# Altium schematic symbol library FPGA_Xilinx_Virtex6.SchLib: 28 symbols (part 12 of 15) (continued)
## XC6VLX550T-FF1760 (continued)
part O pins: A2 IO_L3N_47, A4 IO_L1N_47, B1 IO_L16P_47, B2 IO_L16N_47, B3 IO_L3P_47, B4 IO_L1P_47, B5 VCCO_47, C1 IO_L18P_47, C2 VCCO_47, C3 IO_L9P_MRCC_47, C4 IO_L9N_MRCC_47, C5 IO_L7P_47, D1 IO_L1P_46, D2 IO_L18N_47, D3 IO_L14N_VREF_47, D5 IO_L7N_47, E2 IO_L1N_46, E3 IO_L14P_47, E4 IO_L10N_MRCC_47, E5 IO_L5N_47, F1 IO_L3P_46, F2 IO_L3N_46, F3 VCCO_46, F4 IO_L10P_MRCC_47, F5 IO_L5P_47, G1 IO_L8P_SRCC_46, G2 IO_L8N_SRCC_46, G3 IO_L7P_46, G4 IO_L6N_47, H1 IO_L16N_46, H3 IO_L7N_46, H4 IO_L6P_47, H5 IO_L2P_47, H6 IO_L2N_47, J1 IO_L16P_46, J2 IO_L19P_46, J3 IO_L19N_46, J4 VCCO_47, J5 IO_L15N_47, J6 IO_L0P_47, K1 VCCO_46, K2 IO_L6N_46, K3 IO_L9P_MRCC_46, K4 IO_L9N_MRCC_46, K5 IO_L15P_47, K7 IO_L0N_47, L1 IO_L18P_46, L2 IO_L6P_46, L4 IO_L4P_46, L5 IO_L0P_46, L6 IO_L12P_VRN_47, L7 IO_L8N_SRCC_47, L8 VCCO_47, L9 IO_L13N_47, M2 IO_L18N_46, M3 IO_L14N_VREF_46, M4 IO_L4N_VREF_46, M5 VCCO_46, M6 IO_L0N_46, M7 IO_L12N_VRP_47, M8 IO_L8P_SRCC_47, M9 IO_L13P_47, M11 IO_L17P_47, N3 IO_L14P_46, N4 IO_L10N_MRCC_46, N5 IO_L5P_46, N6 IO_L5N_46, N8 IO_L11P_SRCC_46, N9 IO_L4P_47, N10 IO_L4N_VREF_47, N11 IO_L17N_47, N12 VCCO_47, N13 IO_L11P_SRCC_47, P5 IO_L10P_MRCC_46, P6 IO_L15N_46, P7 IO_L11N_SRCC_46, P8 IO_L17P_46, P9 VCCO_46, P10 IO_L13N_46, P11 IO_L19P_47, P12 IO_L19N_47, P13 IO_L11N_SRCC_47, R6 VCCO_46, R7 IO_L15P_46, R8 IO_L17N_46, R9 IO_L13P_46, R10 IO_L2N_46, T9 IO_L2P_46, T10 IO_L12N_VRP_46, T11 IO_L12P_VRN_46
part P pins: AA21 VREFN_0, AA22 VP_0, AB21 VN_0, AB22 VREFP_0, AC21 DXN_0, AC22 DXP_0, AD31 RDWR_B_0, AE12 TMS_0, AF13 CCLK_0, AF14 TDI_0, AF29 DIN_0, AF30 CSI_B_0, AH13 TDO_0, AH14 TCK_0, AH28 DOUT_BUSY_0, R14 INIT_B_0, R16 VCCO_0, R29 M1_0, R30 M0_0, T14 DONE_0, T15 HSWAPEN_0, T29 M2_0, T30 PROGRAM_B_0, U15 VCCO_0
part Q pins: A3 GND, A13 GND, A23 GND, A33 GND, AA12 VCCAUX, AA14 VCCINT, AA16 VCCINT, AA18 VCCINT, AA20 VCCINT, AA24 VCCINT, AA26 VCCINT, AA28 VCCINT, AA30 VCCAUX, AB13 VCCAUX, AB15 VCCINT, AB17 VCCINT, AB19 VCCINT, AB23 VCCINT, AB25 VCCINT, AB27 VCCINT, AB29 VCCAUX, AB31 VCCAUX, AC12 VCCAUX, AC14 VCCINT, AC16 VCCINT, AC18 VCCINT, AC20 VCCINT, AC24 VCCINT, AC26 VCCINT, AC28 VCCINT, AC30 VCCAUX, AD13 VCCAUX, AD15 VCCINT, AD17 VCCINT, AD19 VCCINT, AD21 VCCINT, AD23 VCCINT, AD25 VCCINT, AD27 VCCINT, AD29 VCCAUX, AE14 VCCINT, AE16 VCCINT, AE18 VCCINT, AE20 VCCINT, AE22 VCCINT, AE24 VCCINT, AE26 VCCINT, AE28 VCCINT, AE30 VCCAUX, AF15 VCCINT, AF17 VCCINT, AF19 VCCINT, AF21 VCCINT, AF23 VCCINT, AF25 VCCINT, AF27 VCCINT, AG14 VCCINT, AG16 VCCINT, AG18 VCCINT, AG20 VCCINT, AG22 VCCINT, AG24 VCCINT, AG26 VCCINT, AG28 VCCINT, AG29 VFS_0, AH15 VCCINT, AH17 VCCINT, AH19 VCCINT, AH21 VCCINT, AH23 VCCINT, AH25 VCCINT, AH27 VCCINT, B10 GND, B20 GND, B30 GND, B40 GND, C7 GND, C17 GND, C27 GND, C37 GND, D4 GND, D14 GND, D24 GND, D34 GND, E1 GND, E11 GND, E21 GND, E31 GND, E41 GND, F8 GND, F18 GND, F28 GND, F38 GND, G5 GND, G15 GND, G25 GND, G35 GND, H2 GND, H12 GND, H22 GND, H32 GND, H42 GND, J9 GND, J19 GND, J29 GND, J39 GND, K6 GND, K16 GND, K26 GND, K36 GND, L3 GND, L13 GND, L23 GND, L33 GND, M10 GND, M20 GND, M30 GND, M40 GND, N7 GND, N17 GND, N27 GND, N37 GND, P4 GND, P14 GND, P24 GND, P34 GND, R1 GND, R11 GND, R12 VCCAUX, R13 GND, R18 VCCINT, R19 GND, R20 VCCINT, R21 GND, R22 VCCINT, R23 GND, R24 VCCINT, R31 GND, R41 GND, T8 GND, T12 GND, T13 VCCAUX, T16 GND, T17 VCCINT, T18 GND, T19 VCCINT, T20 GND, T21 VCCINT, T22 GND, T23 VCCINT, T24 GND, T25 VCCINT, T26 GND, T27 VCCINT, T28 GND, T38 GND, U5 GND, U12 VCCAUX, U13 GND, U14 VBATT_0, U16 VCCINT, U17 GND, U18 VCCINT, U19 GND, U20 VCCINT, U21 GND, U22 VCCINT, U23 GND, U24 VCCINT, U25 GND, U26 VCCINT, U27 GND, U28 VCCINT, U29 GND, U30 VCCAUX, U35 GND, V2 GND, V12 GND, V13 VCCAUX, V14 GND, V15 VCCINT, V16 GND, V17 VCCINT, V18 GND, V19 VCCINT, V20 GND, V21 VCCINT, V22 GND, V23 VCCINT, V24 GND, V25 VCCINT, V26 GND, V27 VCCINT, V28 GND, V29 VCCAUX, V30 GND, V31 VCCAUX, V32 GND, V42 GND, W9 GND, W12 VCCAUX, W14 VCCINT, W16 VCCINT, W18 VCCINT, W20 VCCINT, W22 VCCINT, W24 VCCINT, W26 VCCINT, W28 VCCINT, W30 VCCAUX, Y13 VCCAUX, Y15 VCCINT, Y17 VCCINT, Y19 VCCINT, Y21 AVSS_0, Y22 AVDD_0, Y23 VCCINT, Y25 VCCINT, Y27 VCCINT, Y29 VCCINT, Y31 VCCAUX
part R pins: AA3 GND, AA13 GND, AA15 GND, AA17 GND, AA19 GND, AA23 GND, AA25 GND, AA27 GND, AA29 GND, AA31 GND, AA33 GND, AB10 GND, AB12 GND, AB14 GND, AB16 GND, AB18 GND, AB20 GND, AB24 GND, AB26 GND, AB28 GND, AB30 GND, AB40 GND, AC7 GND, AC13 GND, AC15 GND, AC17 GND, AC19 GND, AC23 GND, AC25 GND, AC27 GND, AC29 GND, AC31 GND, AC37 GND, AD4 GND, AD12 GND, AD14 GND, AD16 GND, AD18 GND, AD20 GND, AD22 GND, AD24 GND, AD26 GND, AD28 GND, AD30 GND, AD34 GND, AE1 GND, AE11 GND, AE13 GND, AE15 GND, AE17 GND, AE19 GND, AE21 GND, AE23 GND, AE25 GND, AE27 GND, AE29 GND, AE31 GND, AE41 GND, AF8 GND, AF16 GND, AF18 GND, AF20 GND, AF22 GND, AF24 GND, AF26 GND, AF28 GND, AF38 GND, AG5 GND, AG13 GND, AG15 GND, AG17 GND, AG19 GND, AG21 GND, AG23 GND, AG25 GND, AG27 GND, AG35 GND, AH2 GND, AH12 GND, AH18 GND, AH20 GND, AH22 GND, AH24 GND, AH32 GND, AH42 GND, AJ9 GND, AJ19 GND, AJ29 GND, AJ39 GND, AK6 GND, AK16 GND, AK26 GND, AK36 GND, AL3 GND, AL13 GND, AL23 GND, AL33 GND, AM10 GND, AM20 GND, AM30 GND, AM40 GND, AN7 GND, AN17 GND, AN27 GND, AN37 GND, AP4 GND, AP14 GND, AP24 GND, AP34 GND, AR1 GND, AR11 GND, AR21 GND, AR31 GND, AR41 GND, AT8 GND, AT18 GND, AT28 GND, AT38 GND, AU5 GND, AU15 GND, AU25 GND, AU35 GND, AV2 GND, AV12 GND, AV22 GND, AV32 GND, AV42 GND, AW9 GND, AW19 GND, AW29 GND, AW39 GND, AY6 GND, AY16 GND, AY26 GND, AY36 GND, BA3 GND, BA13 GND, BA23 GND, BA33 GND, BB10 GND, BB20 GND, BB30 GND, BB40 GND, W13 GND, W15 GND, W17 GND, W19 GND, W21 GND, W23 GND, W25 GND, W27 GND, W29 GND, W31 GND, W39 GND, Y6 GND, Y12 GND, Y14 GND, Y16 GND, Y18 GND, Y20 GND, Y24 GND, Y26 GND, Y28 GND, Y30 GND, Y36 GND

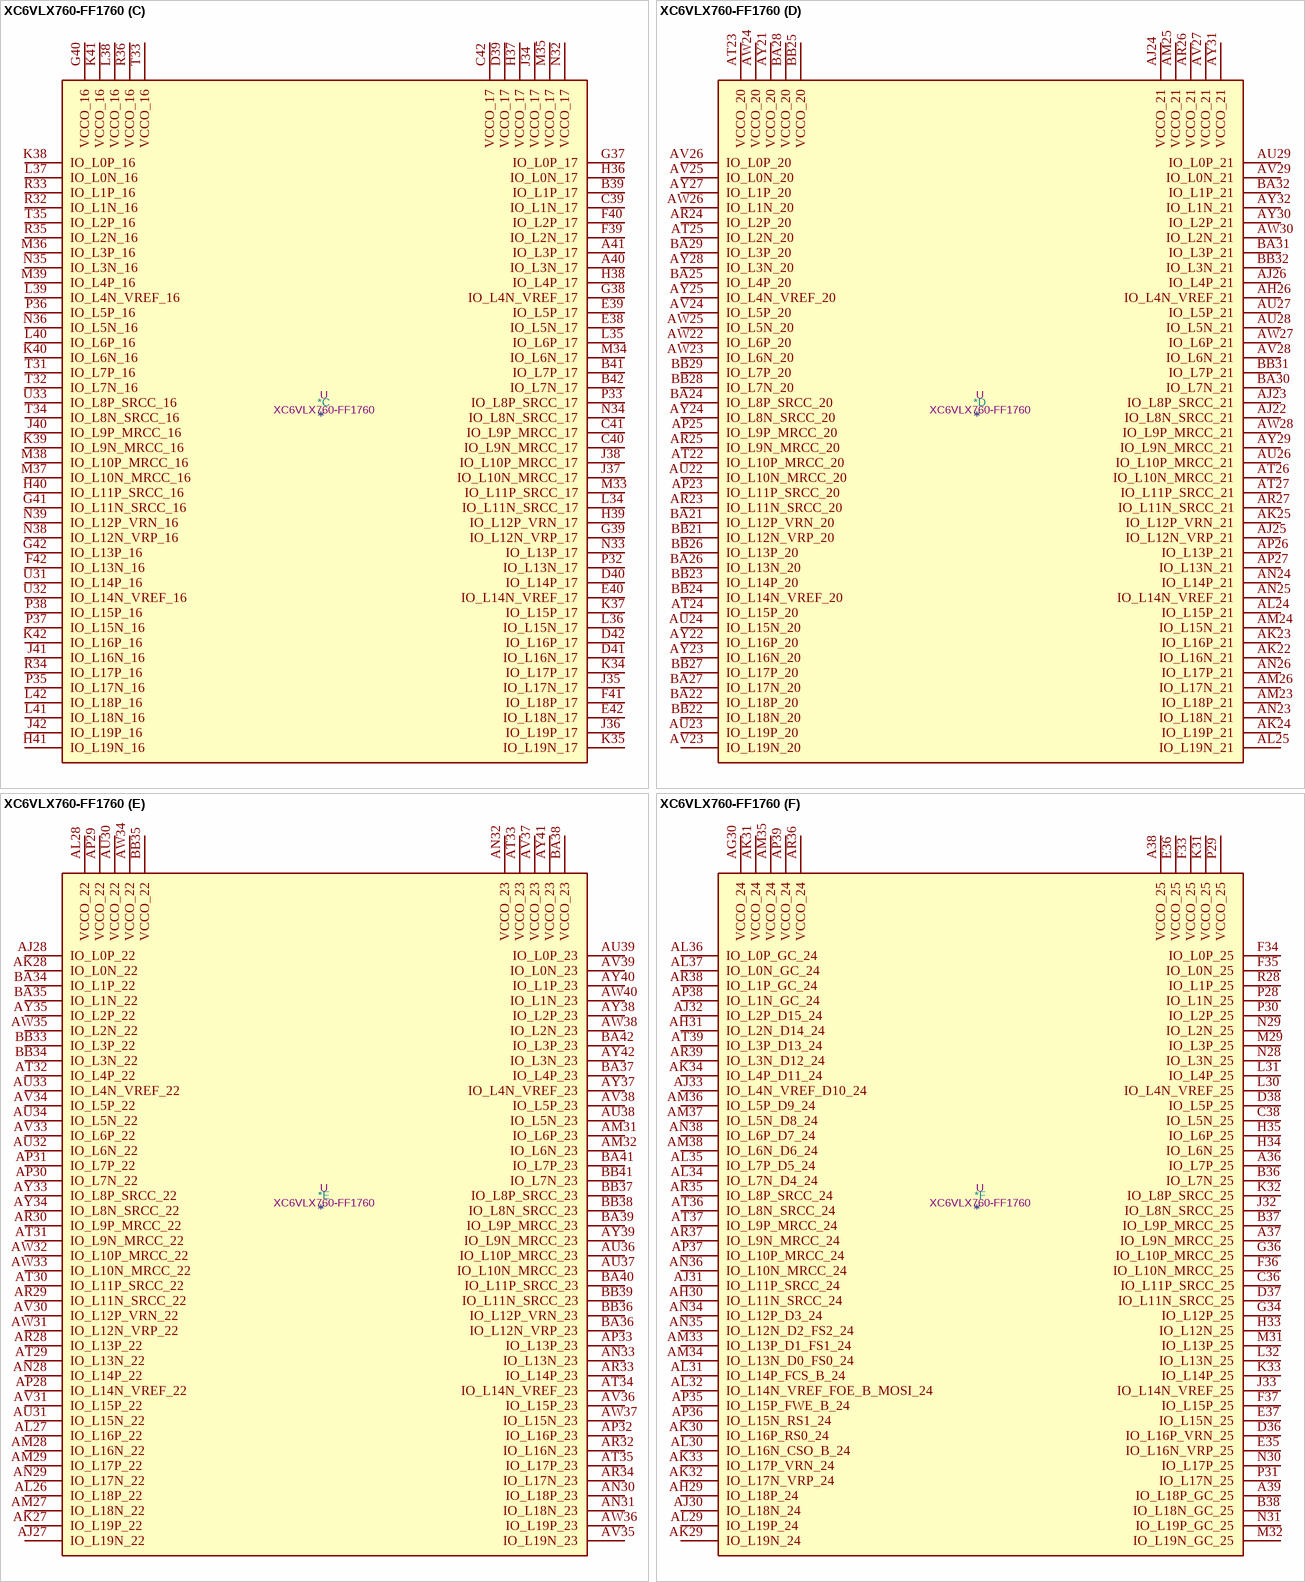
[diagram p81: symbol XC6VLX760-FF1760]

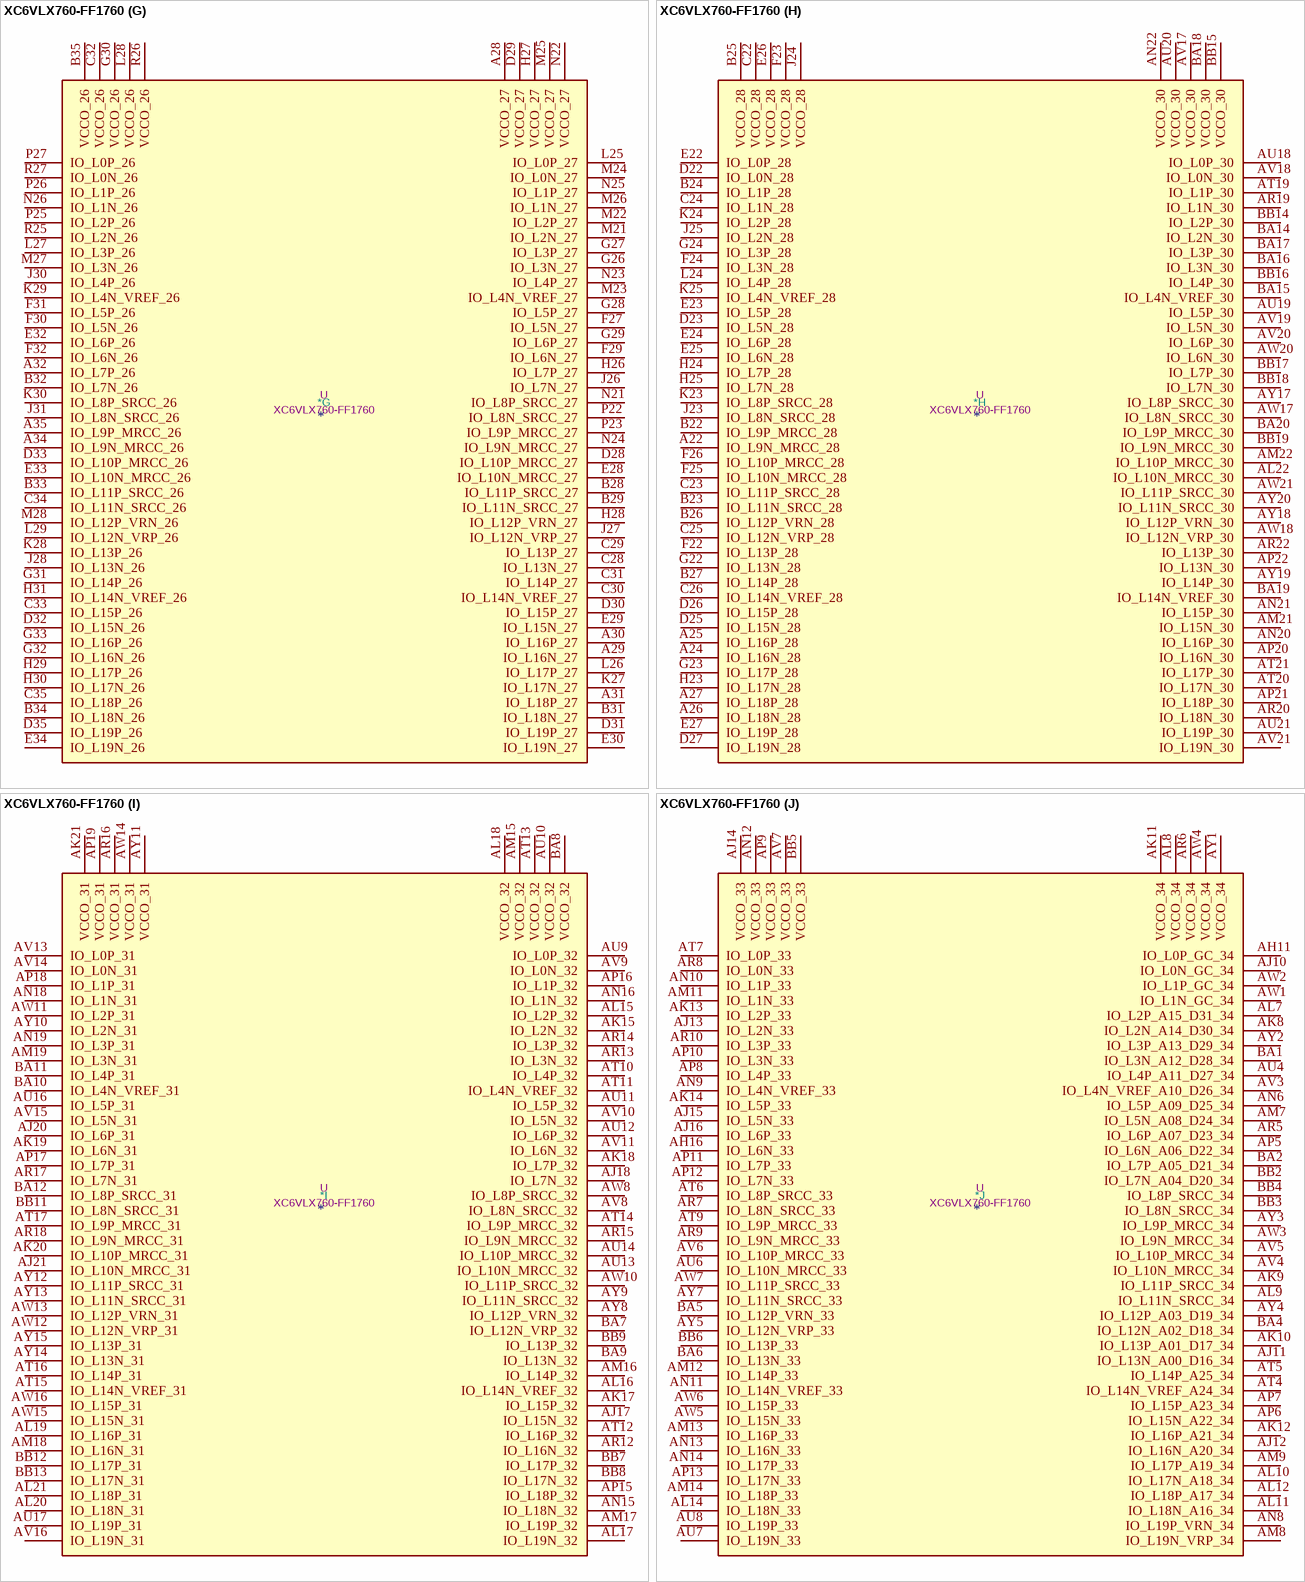
[diagram p82: symbol XC6VLX760-FF1760]

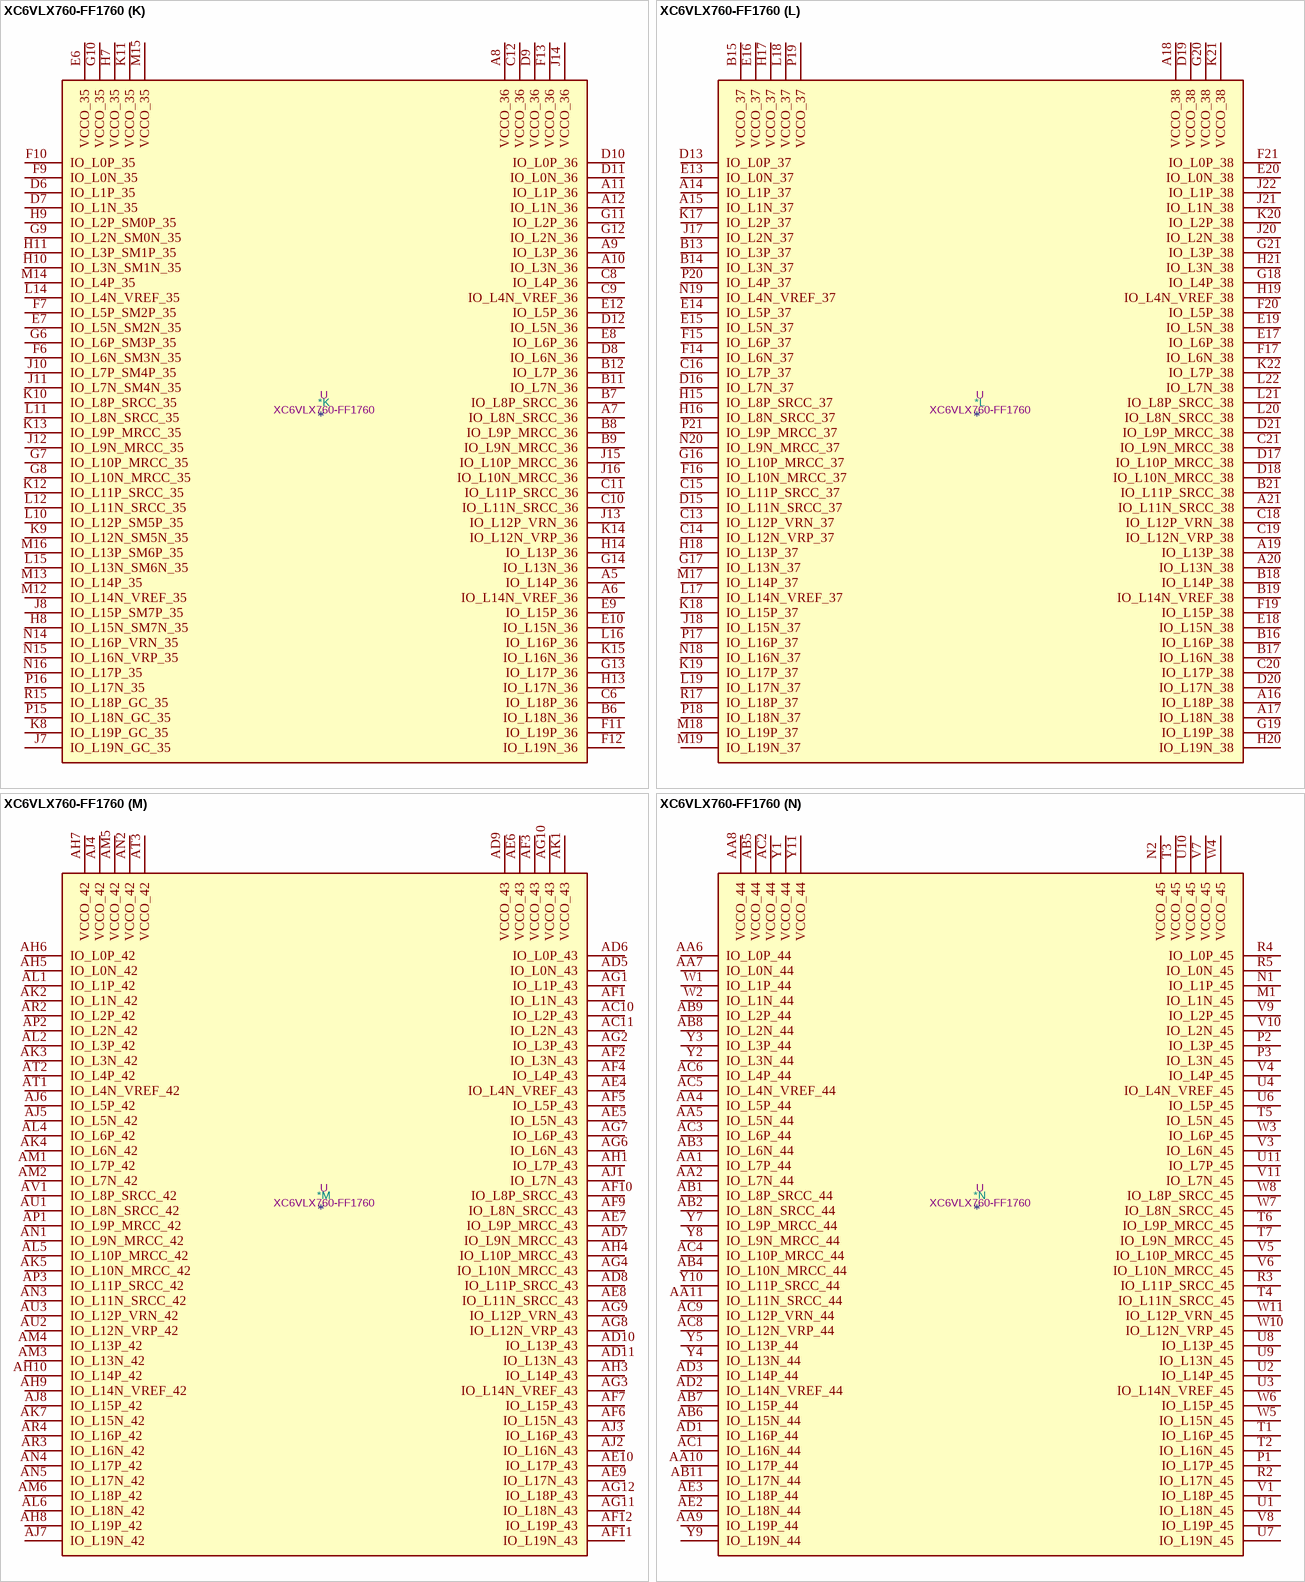
[diagram p83: symbol XC6VLX760-FF1760]

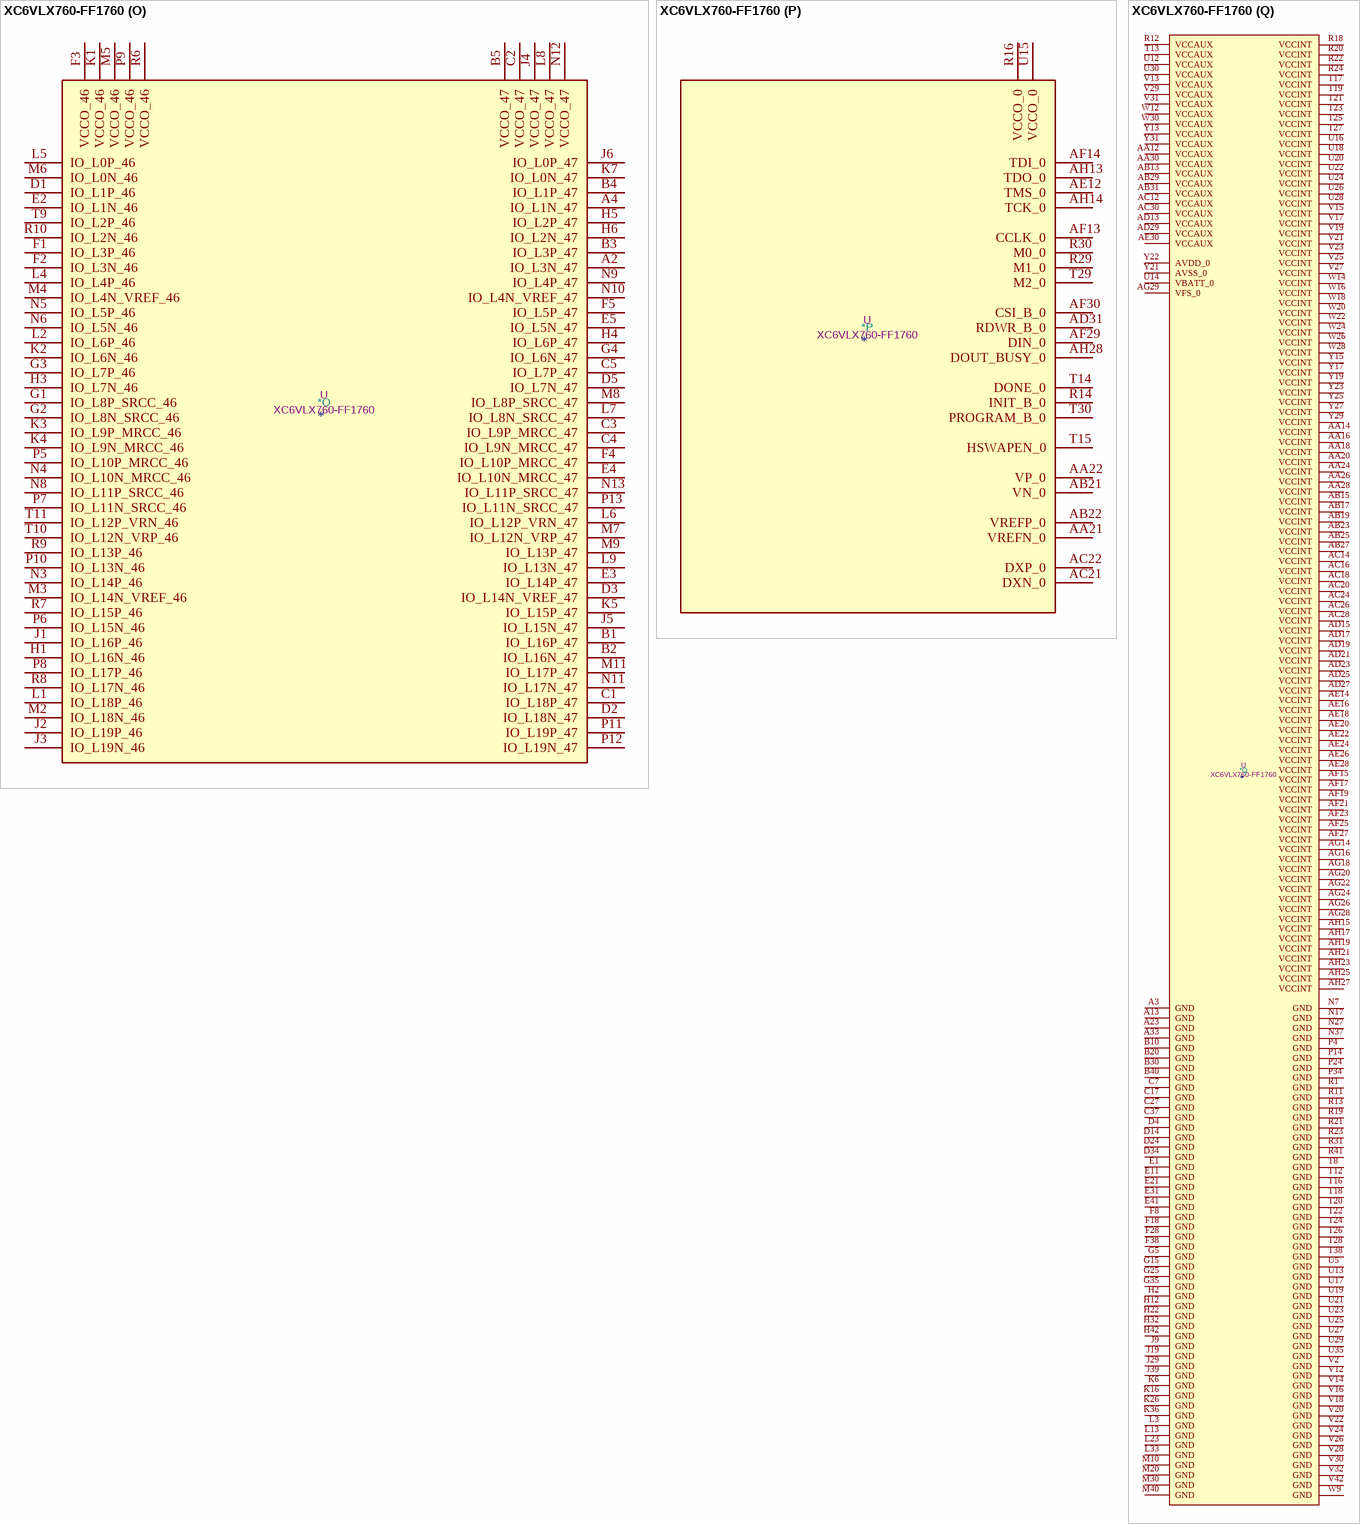
[diagram p84: symbol XC6VLX760-FF1760]

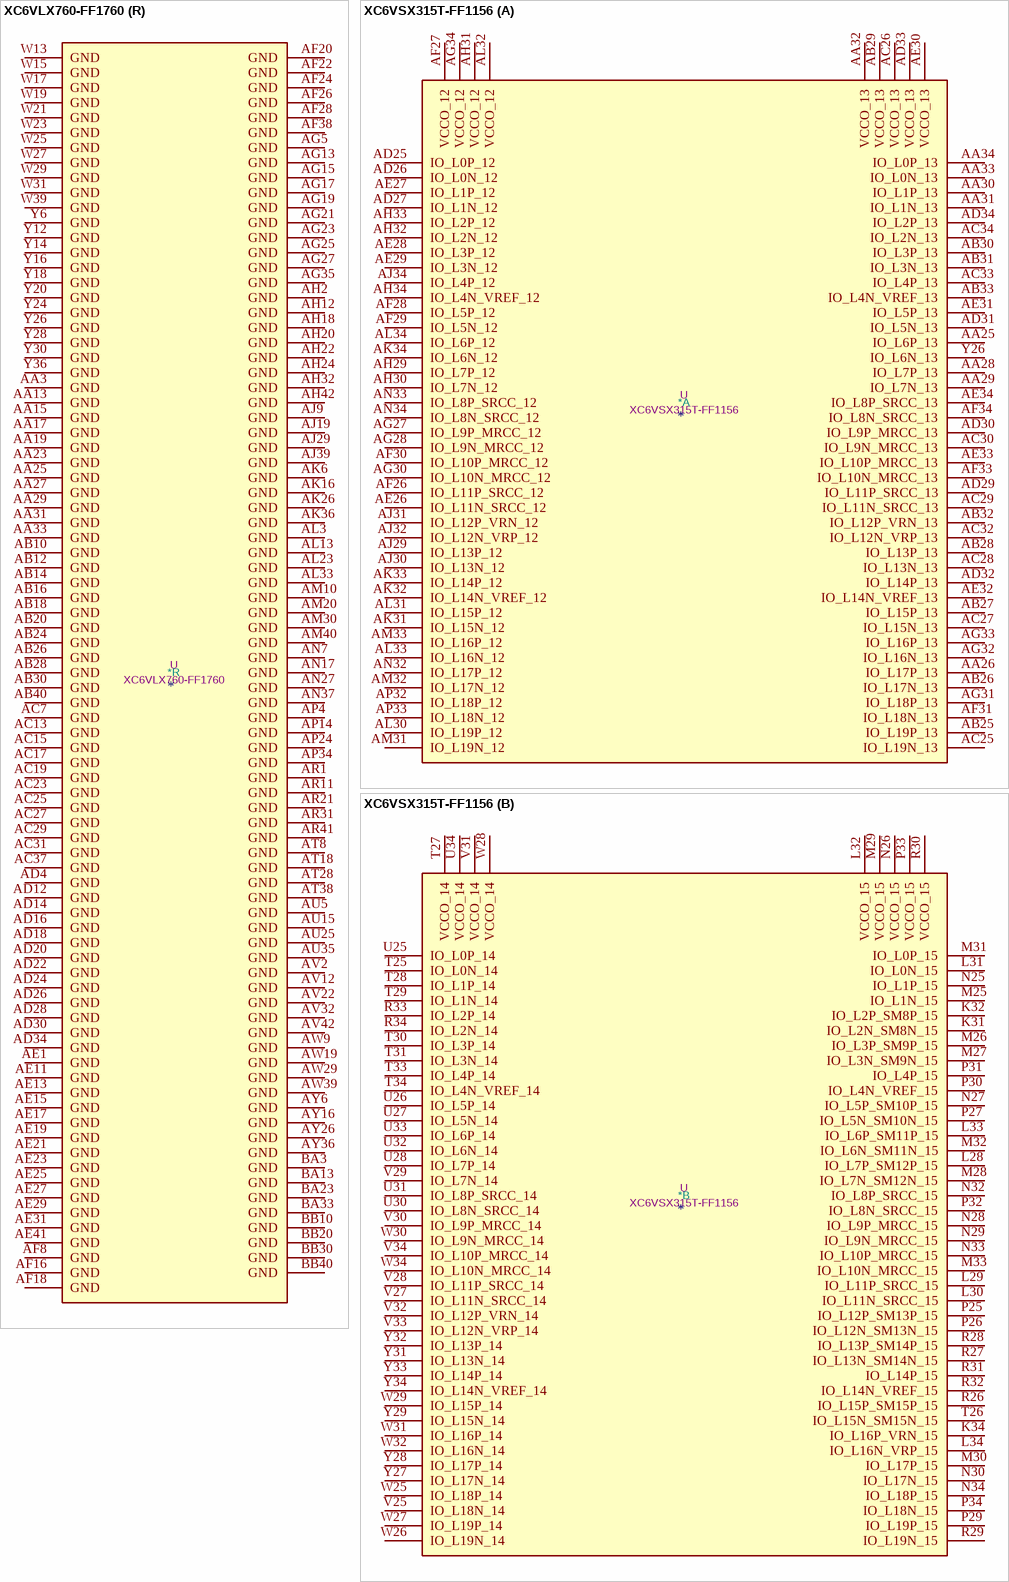
[diagram p85: symbols XC6VLX760-FF1760 to XC6VSX315T-FF1156]